# Altium footprint library Connectors.PcbLib: 122 footprints (part 4 of 8)
Each footprint in its own frame and in the unit in brackets; x right, y up, seen from the top. Pads: shape width x height; smd on the part's side, far side on the other; paste and mask are expansions set on the pad; w line width, h text height; cw(c..) or ccw(c..) is an arc to the next point about the centre after c.
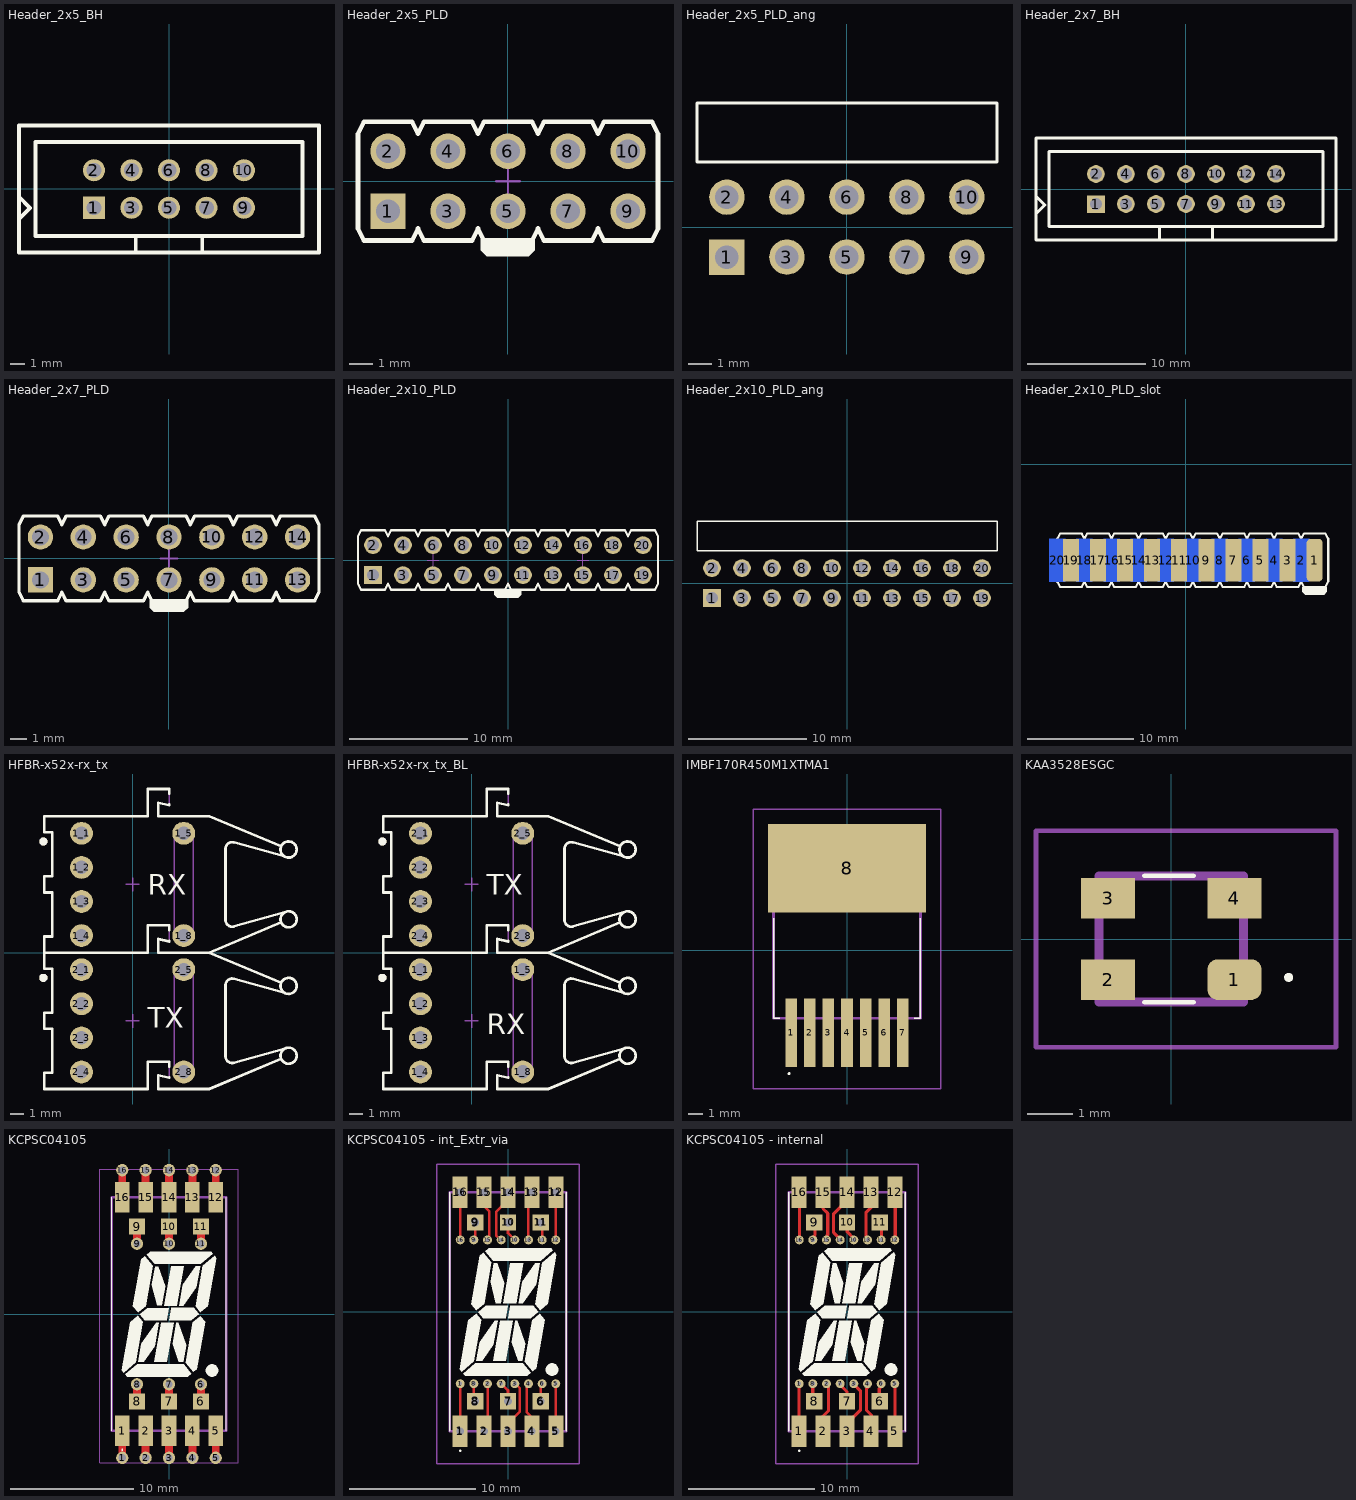
[diagram p3: the footprints below, top view; thin cyan lines are the x and y axes]

## Header_2x5_BH [mm] "BH-10_IDC-10_DS-1013-10S"
height 9
pads (10):
  rect 1.5x1.5 hole 1: 1(-5.08,-1.27)
  round 1.5 hole 1: 2(-5.08,1.27) 3(-2.54,-1.27) 4(-2.54,1.27) 5(0,-1.27) 6(0,1.27) 7(2.54,-1.27) 8(2.54,1.27) 9(5.08,-1.27) 10(5.08,1.27)
Top Overlay:
  lines w0.254: -2.25,-4.3 -2.25,-3.18 2.25,-3.18 2.25,-4.3 ; -10.16,-4.3 -10.16,4.3 10.16,4.3 10.16,-4.3 -10.16,-4.3 ; -10.16,-2.031 -10.16,-0.531 -9.41,-1.281 -10.16,-2.031 ; -9.04,-3.18 9.04,-3.18 9.04,3.18 -9.04,3.18 -9.04,-3.18
3D body "BH-10_IDC-10_DS-1013-10S.STEP": height 9, standoff -3, extent -10.16,-4.375 10.16,4.725

## Header_2x5_PLD [mm] "6 Contacts - Pitch 2.54mm - Dual Row Through Mount Straight Header (Post Lead = 6.35mm, Tail Lead 3.05mm, Insulator 1.52mm)"
height 7.87
pads (10):
  rect 1.5x1.5 hole 1: 1(-5.08,-1.27)
  round 1.5 hole 1: 2(-5.08,1.27) 3(-2.54,-1.27) 4(-2.54,1.27) 5(0,-1.27) 6(0,1.27) 7(2.54,-1.27) 8(2.54,1.27) 9(5.08,-1.27) 10(5.08,1.27)
Top Overlay:
  region: -1.143,-2.464 -1.143,-2.921 -0.889,-3.175 0.889,-3.175 1.143,-2.921 1.143,-2.464
  lines w0.2: -6.35,-2.007 -6.35,2.007 -6.096,2.515 -4.064,2.515 -3.81,2.007 -3.556,2.515 -1.524,2.515 -1.27,2.007 -1.016,2.515 1.016,2.515 1.27,2.007 1.524,2.515 3.556,2.515 3.81,2.007 4.064,2.515 6.096,2.515 6.35,2.007 6.35,-2.007 6.096,-2.515 4.064,-2.515 3.81,-2.007 3.556,-2.515 1.524,-2.515 1.27,-2.007 1.016,-2.515 -1.016,-2.515 -1.27,-2.007 -1.524,-2.515 -3.556,-2.515 -3.81,-2.007 -4.064,-2.515 -6.096,-2.515 -6.35,-2.007
Mechanical 8:
  lines w0.1: -0.5,0 0,0 ; 0,-0.5 0,0 ; 0,0.5 0,0 ; 0.5,0 0,0
Mechanical 14:
  lines w0.1: -6.35,-2.007 -6.096,-2.515 -4.064,-2.515 -3.81,-2.007 -3.556,-2.515 -1.524,-2.515 -1.27,-2.007 -1.016,-2.515 1.016,-2.515 1.27,-2.007 1.524,-2.515 3.556,-2.515 3.81,-2.007 4.064,-2.515 6.096,-2.515 6.35,-2.007 6.35,2.007 6.096,2.515 4.064,2.515 3.81,2.007 3.556,2.515 1.524,2.515 1.27,2.007 1.016,2.515 -1.016,2.515 -1.27,2.007 -1.524,2.515 -3.556,2.515 -3.81,2.007 -4.064,2.515 -6.096,2.515 -6.35,2.007 -6.35,-2.007
3D body "BH-10_PLD-6.stp": height 7.87, standoff -3.05, extent -6.35,-2.514 6.35,2.515

## Header_2x5_PLD_ang [mm]
pads (10):
  rect 1.5x1.5 hole 1: 1(-5.08,-1.27)
  round 1.5 hole 1: 2(-5.08,1.27) 3(-2.54,-1.27) 4(-2.54,1.27) 5(0,-1.27) 6(0,1.27) 7(2.54,-1.27) 8(2.54,1.27) 9(5.08,-1.27) 10(5.08,1.27)
Top Overlay:
  lines w0.127: -6.348,2.75 -6.348,5.25 6.357,5.25 6.357,2.75 -6.348,2.75
3D body "HR-2x5.STEP": height 5.08, standoff -3, extent -6.35,-1.612 6.35,11.25

## Header_2x7_BH [mm] "BH-14_IDC-14_DS-1013-14S"
height 9
pads (14):
  rect 1.5x1.5 hole 1: 1(-7.62,-1.281)
  round 1.5 hole 1: 2(-7.62,1.27) 3(-5.08,-1.27) 4(-5.08,1.27) 5(-2.54,-1.27) 6(-2.54,1.27) 7(0,-1.27) 8(0,1.27) 9(2.54,-1.27) 10(2.54,1.27) 11(5.08,-1.27) 12(5.08,1.27) 13(7.62,-1.27) 14(7.62,1.281)
Top Overlay:
  lines w0.254: -2.25,-4.3 -2.25,-3.18 2.25,-3.18 2.25,-4.3 ; -12.69,-2.106 -11.94,-1.356 -12.69,-0.606 -12.69,-2.106 ; -12.683,-4.3 -7.62,-4.3 7.62,-4.3 12.696,-4.3 12.696,4.3 7.62,4.3 -7.62,4.3 -12.683,4.3 -12.683,-4.3 ; -11.57,-3.18 -11.57,3.18 11.576,3.18 11.576,-3.18 -11.57,-3.18
3D body "BH-14_IDC-14_DS-1013-14S.STEP": height 9, standoff -3, extent -12.69,-4.375 12.69,4.725

## Header_2x7_PLD [mm] "6 Contacts - Pitch 2.54mm - Dual Row Through Mount Straight Header (Post Lead = 6.35mm, Tail Lead 3.05mm, Insulator 1.52mm)"
height 7.87
pads (14):
  rect 1.5x1.5 hole 1: 1(-7.62,-1.27)
  round 1.5 hole 1: 2(-7.62,1.27) 3(-5.08,-1.27) 4(-5.08,1.27) 5(-2.54,-1.27) 6(-2.54,1.27) 7(0,-1.27) 8(0,1.27) 9(2.54,-1.27) 10(2.54,1.27) 11(5.08,-1.27) 12(5.08,1.27) 13(7.62,-1.27) 14(7.62,1.27)
Top Overlay:
  region: -1.143,-2.464 -1.143,-2.921 -0.889,-3.175 0.889,-3.175 1.143,-2.921 1.143,-2.464
  lines w0.2: -8.89,-2.007 -8.89,2.007 -8.636,2.515 -6.604,2.515 -6.35,2.007 -6.096,2.515 -4.064,2.515 -3.81,2.007 -3.556,2.515 -1.524,2.515 -1.27,2.007 -1.016,2.515 1.016,2.515 1.27,2.007 1.524,2.515 3.556,2.515 3.81,2.007 4.064,2.515 6.096,2.515 6.35,2.007 6.604,2.515 8.636,2.515 8.89,2.007 8.89,-2.007 8.636,-2.515 6.604,-2.515 6.35,-2.007 6.096,-2.515 4.064,-2.515 3.81,-2.007 3.556,-2.515 1.524,-2.515 1.27,-2.007 1.016,-2.515 -1.016,-2.515 -1.27,-2.007 -1.524,-2.515 -3.556,-2.515 -3.81,-2.007 -4.064,-2.515 -6.096,-2.515 -6.35,-2.007 -6.604,-2.515 -8.636,-2.515 -8.89,-2.007
Mechanical 8:
  lines w0.1: -0.5,0 0,0 ; 0,-0.5 0,0 ; 0,0.5 0,0 ; 0.5,0 0,0
Mechanical 14:
  lines w0.1: -8.89,-2.007 -8.89,2.007 -8.636,2.515 -6.604,2.515 -6.35,2.007 -6.096,2.515 -4.064,2.515 -3.81,2.007 -3.556,2.515 -1.524,2.515 -1.27,2.007 -1.016,2.515 1.016,2.515 1.27,2.007 1.524,2.515 3.556,2.515 3.81,2.007 4.064,2.515 6.096,2.515 6.35,2.007 6.604,2.515 8.636,2.515 8.89,2.007 8.89,-2.007 8.636,-2.515 6.604,-2.515 6.35,-2.007 6.096,-2.515 4.064,-2.515 3.81,-2.007 3.556,-2.515 1.524,-2.515 1.27,-2.007 1.016,-2.515 -1.016,-2.515 -1.27,-2.007 -1.524,-2.515 -3.556,-2.515 -3.81,-2.007 -4.064,-2.515 -6.096,-2.515 -6.35,-2.007 -6.604,-2.515 -8.636,-2.515 -8.89,-2.007
3D body "BH-14_PLD-14.stp": height 7.87, standoff -3.05, extent -8.89,-2.514 8.89,2.515

## Header_2x10_PLD [mm] "6 Contacts - Pitch 2.54mm - Dual Row Through Mount Straight Header (Post Lead = 6.35mm, Tail Lead 3.05mm, Insulator 1.52mm)"
height 7.87
pads (20):
  rect 1.5x1.5 hole 1: 1(-11.43,-1.27)
  round 1.5 hole 1: 2(-11.43,1.27) 3(-8.89,-1.27) 4(-8.89,1.27) 5(-6.35,-1.27) 6(-6.35,1.27) 7(-3.81,-1.27) 8(-3.81,1.27) 9(-1.27,-1.27) 10(-1.27,1.27) 11(1.27,-1.27) 12(1.27,1.27) 13(3.81,-1.27) 14(3.81,1.27) 15(6.35,-1.27) 16(6.35,1.27) 17(8.89,-1.27) 18(8.89,1.27) 19(11.43,-1.27) 20(11.43,1.27)
Top Overlay:
  region: -1.143,-2.464 -1.143,-2.921 -0.889,-3.175 0.889,-3.175 1.143,-2.921 1.143,-2.464
  lines w0.2: 12.7,-2.007 12.446,-2.515 10.414,-2.515 10.16,-2.007 9.906,-2.515 7.874,-2.515 7.62,-2.007 7.366,-2.515 5.334,-2.515 5.08,-2.007 4.826,-2.515 2.794,-2.515 2.54,-2.007 2.286,-2.515 0.254,-2.515 0,-2.007 -0.254,-2.515 -2.286,-2.515 -2.54,-2.007 -2.794,-2.515 -4.826,-2.515 -5.08,-2.007 -5.334,-2.515 -7.366,-2.515 -7.62,-2.007 -7.874,-2.515 -9.906,-2.515 -10.16,-2.007 -10.414,-2.515 -12.446,-2.515 -12.7,-2.007 -12.7,2.007 -12.446,2.515 -10.414,2.515 -10.16,2.007 -9.906,2.515 -7.874,2.515 -7.62,2.007 -7.366,2.515 -5.334,2.515 -5.08,2.007 -4.826,2.515 -2.794,2.515 -2.54,2.007 -2.286,2.515 -0.254,2.515 0,2.007 0.254,2.515 2.286,2.515 2.54,2.007 2.794,2.515 4.826,2.515 5.08,2.007 5.334,2.515 7.366,2.515 7.62,2.007 7.874,2.515 9.906,2.515 10.16,2.007 10.414,2.515 12.446,2.515 12.7,2.007 ; 12.7,-1.981 12.7,2.032
Mechanical 8:
  lines w0.1: -6.85,0 -6.35,0 ; -6.35,-0.5 -6.35,0 ; -6.35,0.5 -6.35,0 ; -5.85,0 -6.35,0 ; 5.85,0 6.35,0 ; 6.35,-0.5 6.35,0 ; 6.35,0.5 6.35,0 ; 6.85,0 6.35,0
Mechanical 14:
  lines w0.1: 12.7,-2.007 12.446,-2.515 10.414,-2.515 10.16,-2.007 9.906,-2.515 7.874,-2.515 7.62,-2.007 7.366,-2.515 5.334,-2.515 5.08,-2.007 4.826,-2.515 2.794,-2.515 2.54,-2.007 2.286,-2.515 0.254,-2.515 0,-2.007 -0.254,-2.515 -2.286,-2.515 -2.54,-2.007 -2.794,-2.515 -4.826,-2.515 -5.08,-2.007 -5.334,-2.515 -7.366,-2.515 -7.62,-2.007 -7.874,-2.515 -9.906,-2.515 -10.16,-2.007 -10.414,-2.515 -12.446,-2.515 -12.7,-2.007 -12.7,2.007 -12.446,2.515 -10.414,2.515 -10.16,2.007 -9.906,2.515 -7.874,2.515 -7.62,2.007 -7.366,2.515 -5.334,2.515 -5.08,2.007 -4.826,2.515 -2.794,2.515 -2.54,2.007 -2.286,2.515 -0.254,2.515 0,2.007 0.254,2.515 2.286,2.515 2.54,2.007 2.794,2.515 4.826,2.515 5.08,2.007 5.334,2.515 7.366,2.515 7.62,2.007 7.874,2.515 9.906,2.515 10.16,2.007 10.414,2.515 12.446,2.515 12.7,2.007 ; 12.7,-1.981 12.7,2.032
3D body "BH-10_PLD-6.stp": height 7.87, standoff -3.05, extent -12.7,-2.514 0,2.515
3D body "BH-10_PLD-6.stp": height 7.87, standoff -3.05, extent 0,-2.515 12.7,2.514

## Header_2x10_PLD_ang [mm]
pads (20):
  rect 1.5x1.5 hole 1: 1(-11.43,-1.27)
  round 1.5 hole 1: 2(-11.43,1.27) 3(-8.89,-1.27) 4(-8.89,1.27) 5(-6.35,-1.27) 6(-6.35,1.27) 7(-3.81,-1.27) 8(-3.81,1.27) 9(-1.27,-1.27) 10(-1.27,1.27) 11(1.27,-1.27) 12(1.27,1.27) 13(3.81,-1.27) 14(3.81,1.27) 15(6.35,-1.27) 16(6.35,1.27) 17(8.89,-1.27) 18(8.89,1.27) 19(11.43,-1.27) 20(11.43,1.27)
Top Overlay:
  lines w0.127: -12.7,2.75 -12.7,5.25 12.7,5.25 12.7,2.75 -12.7,2.75
3D body "HR-2x5.STEP": height 5.21, standoff -2.87, extent 0,-1.612 12.7,11.25
3D body "HR-2x5.STEP": height 5.21, standoff -2.87, extent -12.7,-1.612 0,11.25

## Header_2x10_PLD_slot [mm] "6 Contacts - Pitch 2.54mm - Dual Row Through Mount Straight Header (Post Lead = 6.35mm, Tail Lead 3.05mm, Insulator 1.52mm)"
height 7.87
pads (20):
  rrect50% 1.5x4 smd: 1(12.089,-9)
  rect 1.5x4 smd far side: 2(10.819,-9) 4(8.279,-9) 6(5.739,-9) 8(3.199,-9) 10(0.659,-9) 12(-1.881,-9) 14(-4.421,-9) 16(-6.961,-9) 18(-9.501,-9) 20(-12.041,-9)
  rect 1.5x4 smd: 3(9.549,-9) 5(7.009,-9) 7(4.469,-9) 9(1.929,-9) 11(-0.611,-9) 13(-3.151,-9) 15(-5.691,-9) 17(-8.231,-9) 19(-10.771,-9)
Top Overlay:
  region: 10.946,-11.515 10.946,-11.972 11.2,-12.226 12.978,-12.226 13.232,-11.972 13.232,-11.515
  lines w0.2: -12.041,-11.007 -11.787,-11.515 -9.755,-11.515 -9.501,-11.007 -9.247,-11.515 -7.215,-11.515 -6.961,-11.007 -6.707,-11.515 -4.675,-11.515 -4.421,-11.007 -4.167,-11.515 -2.135,-11.515 -1.881,-11.007 -1.627,-11.515 0.405,-11.515 0.659,-11.007 0.913,-11.515 2.945,-11.515 3.199,-11.007 3.453,-11.515 5.485,-11.515 5.739,-11.007 5.993,-11.515 8.025,-11.515 8.279,-11.007 8.533,-11.515 10.565,-11.515 10.819,-11.007 11.073,-11.515 13.105,-11.515 13.359,-11.007 ; -12.041,-6.993 -11.787,-6.485 -9.755,-6.485 -9.501,-6.993 -9.247,-6.485 -7.215,-6.485 -6.961,-6.993 -6.707,-6.485 -4.675,-6.485 -4.421,-6.993 -4.167,-6.485 -2.135,-6.485 -1.881,-6.993 -1.627,-6.485 0.405,-6.485 0.659,-6.993 0.913,-6.485 2.945,-6.485 3.199,-6.993 3.453,-6.485 5.485,-6.485 5.739,-6.993 5.993,-6.485 8.025,-6.485 8.279,-6.993 8.533,-6.485 10.565,-6.485 10.819,-6.993 11.073,-6.485 13.105,-6.485 13.359,-6.993 ; -9.501,-10.981 -9.501,-6.968 ; -6.961,-10.981 -6.961,-6.968 ; -4.421,-10.981 -4.421,-6.968 ; -1.881,-10.981 -1.881,-6.968 ; 0.659,-10.981 0.659,-6.968 ; 3.199,-10.981 3.199,-6.968 ; 5.739,-10.981 5.739,-6.968 ; 8.279,-10.981 8.279,-6.968 ; 10.819,-10.981 10.819,-6.968 ; 13.359,-10.981 13.359,-6.968
  lines w0.254: -12.041,-11.007 -12.041,-6.993 ; -9.501,-11.007 -9.501,-6.993 ; -6.961,-11.007 -6.961,-6.993 ; -4.421,-11.007 -4.421,-6.993 ; -1.881,-11.007 -1.881,-6.993 ; 0.659,-11.007 0.659,-6.993 ; 3.199,-11.007 3.199,-6.993 ; 5.739,-11.007 5.739,-6.993 ; 8.279,-11.007 8.279,-6.993 ; 10.819,-11.007 10.819,-6.993
Bottom Overlay:
  lines w0.2: -12.791,-11.007 -12.537,-11.515 -10.505,-11.515 -10.251,-11.007 -9.997,-11.515 -7.965,-11.515 -7.711,-11.007 -7.457,-11.515 -5.425,-11.515 -5.171,-11.007 -4.917,-11.515 -2.885,-11.515 -2.631,-11.007 -2.377,-11.515 -0.345,-11.515 -0.091,-11.007 0.163,-11.515 2.195,-11.515 2.449,-11.007 2.703,-11.515 4.735,-11.515 4.989,-11.007 5.243,-11.515 7.275,-11.515 7.529,-11.007 7.783,-11.515 9.815,-11.515 10.069,-11.007 10.323,-11.515 12.355,-11.515 12.609,-11.007 ; -12.791,-6.993 -12.537,-6.485 -10.505,-6.485 -10.251,-6.993 -9.997,-6.485 -7.965,-6.485 -7.711,-6.993 -7.457,-6.485 -5.425,-6.485 -5.171,-6.993 -4.917,-6.485 -2.885,-6.485 -2.631,-6.993 -2.377,-6.485 -0.345,-6.485 -0.091,-6.993 0.163,-6.485 2.195,-6.485 2.449,-6.993 2.703,-6.485 4.735,-6.485 4.989,-6.993 5.243,-6.485 7.275,-6.485 7.529,-6.993 7.783,-6.485 9.815,-6.485 10.069,-6.993 10.323,-6.485 12.355,-6.485 12.609,-6.993 ; -10.251,-10.981 -10.251,-6.968 ; -7.711,-10.981 -7.711,-6.968 ; -5.171,-10.981 -5.171,-6.968 ; -2.631,-10.981 -2.631,-6.968 ; -0.091,-10.981 -0.091,-6.968 ; 2.449,-10.981 2.449,-6.968 ; 4.989,-10.981 4.989,-6.968 ; 7.529,-10.981 7.529,-6.968 ; 10.069,-10.981 10.069,-6.968 ; 12.609,-10.981 12.609,-6.968
  lines w0.254: -12.791,-11.007 -12.791,-6.993 ; -10.251,-11.007 -10.251,-6.993 ; -7.711,-11.007 -7.711,-6.993 ; -5.171,-11.007 -5.171,-6.993 ; -2.631,-11.007 -2.631,-6.993 ; -0.091,-11.007 -0.091,-6.993 ; 2.449,-11.007 2.449,-6.993 ; 4.989,-11.007 4.989,-6.993 ; 7.529,-11.007 7.529,-6.993 ; 10.069,-11.007 10.069,-6.993
3D body "IDC.STEP": height 2.99, standoff -4.03, extent -15.03,-8 15.03,1

## HFBR-x52x-rx_tx [mm] "HFBR-0500Z Series, Fiber Optic Transmitter adn Receiver, Through Hole Mount"
height 7.62
pads (12):
  round 1.7 hole 1: 1_1(-3.81,8.89) 1_2(-3.81,6.35) 1_3(-3.81,3.81) 1_4(-3.81,1.27) 1_5(3.81,8.89) 1_8(3.81,1.27) 2_1(-3.81,-1.27) 2_2(-3.81,-3.81) 2_3(-3.81,-6.35) 2_4(-3.81,-8.89) 2_5(3.81,-1.27) 2_8(3.81,-8.89)
Top Overlay:
  circle w0.3: c-6.65,8.28 r0.15
  circle w0.2: c11.62,7.68 r0.6
  circle w0.2: c11.62,2.48 r0.6
  circle w0.2: c11.62,-7.68 r0.6
  circle w0.2: c11.62,-2.48 r0.6
  circle w0.3: c-6.65,-1.88 r0.15
  lines w0.2: 2.72,-9.28 2.72,-9.33 1.92,-9.145 1.92,-10.16 5.72,-10.16 11.067,-7.913 cw(c11.62,-7.68) 11.311,-7.166 7.554,-8.209 cw(c7.42,-7.727) 6.923,-7.78 6.923,-2.38 cw(c7.42,-2.433) 7.554,-1.951 11.311,-2.994 cw(c11.62,-2.48) 11.067,-2.247 5.72,0 ; 2.72,-8.48 2.72,-8.13 1.12,-8.13 1.12,-10.16 -6.58,-10.16 -6.58,-8.96 -5.98,-8.96 -5.98,-5.68 -6.58,-5.68 -6.58,-4.48 -5.98,-4.48 -5.98,-1.2 -6.58,-1.2 -6.58,0 ; 2.72,11.04 2.72,10.99 1.92,11.175 1.92,10.16 5.72,10.16 11.067,7.913 ccw(c11.62,7.68) 11.311,7.166 7.554,8.209 ccw(c7.42,7.727) 6.923,7.78 6.923,2.38 ccw(c7.42,2.433) 7.554,1.951 11.311,2.994 ccw(c11.62,2.48) 11.067,2.247 5.72,0 ; 2.72,11.84 2.72,12.19 1.12,12.19 1.12,10.16 -6.58,10.16 -6.58,8.96 -5.98,8.96 -5.98,5.68 -6.58,5.68 -6.58,4.48 -5.98,4.48 -5.98,1.2 -6.58,1.2 -6.58,0 ; -6.58,0 1.12,0 ; -6.58,0 1.12,0 ; 1.12,0 1.12,2.03 ; 1.12,0 1.12,2.03 ; 1.12,2.03 2.72,2.03 ; 1.12,2.03 2.72,2.03 ; 1.92,0 5.72,0 ; 1.92,0 1.92,1.015 ; 1.92,0 1.92,1.015 ; 1.92,0 5.72,0 ; 1.92,1.015 2.72,0.83 ; 1.92,1.015 2.72,0.83 ; 2.72,0.83 2.72,0.88 2.72,0.83 ; 2.72,2.03 2.72,1.68 2.72,2.03
  text "TX" at 1.143,-5.588 h1.52
  text "RX" at 1.143,4.318 h1.52
Mechanical 8:
  lines w0.1: -4.31,-8.89 -3.81,-8.89 ; -4.31,-6.35 -3.81,-6.35 ; -4.31,-3.81 -3.81,-3.81 ; -4.31,-1.27 -3.81,-1.27 ; -4.31,1.27 -3.81,1.27 ; -4.31,3.81 -3.81,3.81 ; -4.31,6.35 -3.81,6.35 ; -4.31,8.89 -3.81,8.89 ; -3.81,-9.39 -3.81,-8.89 ; -3.81,-8.39 -3.81,-8.89 ; -3.81,-6.85 -3.81,-6.35 ; -3.81,-5.85 -3.81,-6.35 ; -3.81,-4.31 -3.81,-3.81 ; -3.81,-3.31 -3.81,-3.81 ; -3.81,-1.77 -3.81,-1.27 ; -3.81,-0.77 -3.81,-1.27 ; -3.81,0.77 -3.81,1.27 ; -3.81,1.77 -3.81,1.27 ; -3.81,3.31 -3.81,3.81 ; -3.81,4.31 -3.81,3.81 ; -3.81,5.85 -3.81,6.35 ; -3.81,6.85 -3.81,6.35 ; -3.81,8.39 -3.81,8.89 ; -3.81,9.39 -3.81,8.89 ; -3.31,-8.89 -3.81,-8.89 ; -3.31,-6.35 -3.81,-6.35 ; -3.31,-3.81 -3.81,-3.81 ; -3.31,-1.27 -3.81,-1.27 ; -3.31,1.27 -3.81,1.27 ; -3.31,3.81 -3.81,3.81 ; -3.31,6.35 -3.81,6.35 ; -3.31,8.89 -3.81,8.89 ; -0.5,-5.08 0,-5.08 ; -0.5,5.08 0,5.08 ; 0,-5.58 0,-5.08 ; 0,-4.58 0,-5.08 ; 0,4.58 0,5.08 ; 0,5.58 0,5.08 ; 0.5,-5.08 0,-5.08 ; 0.5,5.08 0,5.08 ; 3.31,-8.89 3.81,-8.89 ; 3.31,-1.27 3.81,-1.27 ; 3.31,1.27 3.81,1.27 ; 3.31,8.89 3.81,8.89 ; 3.81,-9.39 3.81,-8.89 ; 3.81,-8.39 3.81,-8.89 ; 3.81,-1.77 3.81,-1.27 ; 3.81,-0.77 3.81,-1.27 ; 3.81,0.77 3.81,1.27 ; 3.81,1.77 3.81,1.27 ; 3.81,8.39 3.81,8.89 ; 3.81,9.39 3.81,8.89 ; 4.31,-8.89 3.81,-8.89 ; 4.31,-1.27 3.81,-1.27 ; 4.31,1.27 3.81,1.27 ; 4.31,8.89 3.81,8.89
Mechanical 14:
  circle w0.3: c-6.65,8.28 r0.15
  circle w0.1: c11.62,2.48 r0.6
  circle w0.1: c11.62,7.68 r0.6
  circle w0.1: c11.62,-2.48 r0.6
  circle w0.1: c11.62,-7.68 r0.6
  circle w0.3: c-6.65,-1.88 r0.15
  lines w0.1: -6.58,0 1.12,0 ; -6.58,0 -6.58,1.2 -5.98,1.2 -5.98,4.48 -6.58,4.48 -6.58,5.68 -5.98,5.68 -5.98,8.96 -6.58,8.96 -6.58,10.16 1.12,10.16 1.12,12.19 2.72,12.19 2.72,10.99 1.92,11.175 1.92,10.16 5.72,10.16 11.067,7.913 ccw(c11.62,7.68) 11.311,7.166 7.554,8.209 ccw(c7.42,7.727) 6.923,7.78 6.923,2.38 ccw(c7.42,2.433) 7.554,1.951 11.311,2.994 ccw(c11.62,2.48) 11.067,2.247 5.72,0 ; -6.58,0 1.12,0 ; -6.58,0 -6.58,-1.2 -5.98,-1.2 -5.98,-4.48 -6.58,-4.48 -6.58,-5.68 -5.98,-5.68 -5.98,-8.96 -6.58,-8.96 -6.58,-10.16 1.12,-10.16 1.12,-8.13 2.72,-8.13 2.72,-9.33 1.92,-9.145 1.92,-10.16 5.72,-10.16 11.067,-7.913 cw(c11.62,-7.68) 11.311,-7.166 7.554,-8.209 cw(c7.42,-7.727) 6.923,-7.78 6.923,-2.38 cw(c7.42,-2.433) 7.554,-1.951 11.311,-2.994 cw(c11.62,-2.48) 11.067,-2.247 5.72,0 ; 1.12,0 1.12,2.03 ; 1.12,0 1.12,2.03 ; 1.12,2.03 2.72,2.03 ; 1.12,2.03 2.72,2.03 ; 1.92,0 1.92,1.015 ; 1.92,0 5.72,0 ; 1.92,0 5.72,0 ; 1.92,0 1.92,1.015 ; 1.92,1.015 2.72,0.83 ; 1.92,1.015 2.72,0.83 ; 2.72,0.83 2.72,2.03 ; 2.72,0.83 2.72,2.03 ; 3.11,-8.89 ccw(c3.81,-8.89) 4.51,-8.89 4.51,-1.27 ccw(c3.81,-1.27) 3.11,-1.27 3.11,-8.89 ; 3.11,1.27 ccw(c3.81,1.27) 4.51,1.27 4.51,8.89 ccw(c3.81,8.89) 3.11,8.89 3.11,1.27
3D body "HFBR-x52x.stp": height 7.66, standoff -4, extent -6.58,0 12.22,12.19
3D body "HFBR-x52x.stp": height 7.66, standoff -4, extent -6.58,-10.16 12.22,2.03

## HFBR-x52x-rx_tx_BL [mm] "HFBR-0500Z Series, Fiber Optic Transmitter adn Receiver, Through Hole Mount"
height 7.62
pads (12):
  round 1.7 hole 1: 1_1(-3.81,-1.27) 1_2(-3.81,-3.81) 1_3(-3.81,-6.35) 1_4(-3.81,-8.89) 1_5(3.81,-1.27) 1_8(3.81,-8.89) 2_1(-3.81,8.89) 2_2(-3.81,6.35) 2_3(-3.81,3.81) 2_4(-3.81,1.27) 2_5(3.81,8.89) 2_8(3.81,1.27)
Top Overlay:
  circle w0.3: c-6.65,-1.88 r0.15
  circle w0.3: c-6.65,8.28 r0.15
  circle w0.2: c11.62,-2.48 r0.6
  circle w0.2: c11.62,-7.68 r0.6
  circle w0.2: c11.62,2.48 r0.6
  circle w0.2: c11.62,7.68 r0.6
  lines w0.2: 2.72,-9.28 2.72,-9.33 1.92,-9.145 1.92,-10.16 5.72,-10.16 11.067,-7.913 cw(c11.62,-7.68) 11.311,-7.166 7.554,-8.209 cw(c7.42,-7.727) 6.923,-7.78 6.923,-2.38 cw(c7.42,-2.433) 7.554,-1.951 11.311,-2.994 cw(c11.62,-2.48) 11.067,-2.247 5.72,0 ; 2.72,-8.48 2.72,-8.13 1.12,-8.13 1.12,-10.16 -6.58,-10.16 -6.58,-8.96 -5.98,-8.96 -5.98,-5.68 -6.58,-5.68 -6.58,-4.48 -5.98,-4.48 -5.98,-1.2 -6.58,-1.2 -6.58,0 ; 2.72,11.04 2.72,10.99 1.92,11.175 1.92,10.16 5.72,10.16 11.067,7.913 ccw(c11.62,7.68) 11.311,7.166 7.554,8.209 ccw(c7.42,7.727) 6.923,7.78 6.923,2.38 ccw(c7.42,2.433) 7.554,1.951 11.311,2.994 ccw(c11.62,2.48) 11.067,2.247 5.72,0 ; 2.72,11.84 2.72,12.19 1.12,12.19 1.12,10.16 -6.58,10.16 -6.58,8.96 -5.98,8.96 -5.98,5.68 -6.58,5.68 -6.58,4.48 -5.98,4.48 -5.98,1.2 -6.58,1.2 -6.58,0 ; -6.58,0 1.12,0 ; -6.58,0 1.12,0 ; 1.12,0 1.12,2.03 ; 1.12,0 1.12,2.03 ; 1.12,2.03 2.72,2.03 ; 1.12,2.03 2.72,2.03 ; 1.92,0 1.92,1.015 ; 1.92,0 1.92,1.015 ; 1.92,0 5.72,0 ; 1.92,0 5.72,0 ; 1.92,1.015 2.72,0.83 ; 1.92,1.015 2.72,0.83 ; 2.72,0.83 2.72,0.88 2.72,0.83 ; 2.72,2.03 2.72,1.68 2.72,2.03
  text "TX" at 1.143,4.318 h1.52
  text "RX" at 1.143,-6.096 h1.52
Mechanical 8:
  lines w0.1: -4.31,-8.89 -3.81,-8.89 ; -4.31,-6.35 -3.81,-6.35 ; -4.31,-3.81 -3.81,-3.81 ; -4.31,-1.27 -3.81,-1.27 ; -4.31,1.27 -3.81,1.27 ; -4.31,3.81 -3.81,3.81 ; -4.31,6.35 -3.81,6.35 ; -4.31,8.89 -3.81,8.89 ; -3.81,-9.39 -3.81,-8.89 ; -3.81,-8.39 -3.81,-8.89 ; -3.81,-6.85 -3.81,-6.35 ; -3.81,-5.85 -3.81,-6.35 ; -3.81,-4.31 -3.81,-3.81 ; -3.81,-3.31 -3.81,-3.81 ; -3.81,-1.77 -3.81,-1.27 ; -3.81,-0.77 -3.81,-1.27 ; -3.81,0.77 -3.81,1.27 ; -3.81,1.77 -3.81,1.27 ; -3.81,3.31 -3.81,3.81 ; -3.81,4.31 -3.81,3.81 ; -3.81,5.85 -3.81,6.35 ; -3.81,6.85 -3.81,6.35 ; -3.81,8.39 -3.81,8.89 ; -3.81,9.39 -3.81,8.89 ; -3.31,-8.89 -3.81,-8.89 ; -3.31,-6.35 -3.81,-6.35 ; -3.31,-3.81 -3.81,-3.81 ; -3.31,-1.27 -3.81,-1.27 ; -3.31,1.27 -3.81,1.27 ; -3.31,3.81 -3.81,3.81 ; -3.31,6.35 -3.81,6.35 ; -3.31,8.89 -3.81,8.89 ; -0.5,-5.08 0,-5.08 ; -0.5,5.08 0,5.08 ; 0,-5.58 0,-5.08 ; 0,-4.58 0,-5.08 ; 0,4.58 0,5.08 ; 0,5.58 0,5.08 ; 0.5,-5.08 0,-5.08 ; 0.5,5.08 0,5.08 ; 3.31,-8.89 3.81,-8.89 ; 3.31,-1.27 3.81,-1.27 ; 3.31,1.27 3.81,1.27 ; 3.31,8.89 3.81,8.89 ; 3.81,-9.39 3.81,-8.89 ; 3.81,-8.39 3.81,-8.89 ; 3.81,-1.77 3.81,-1.27 ; 3.81,-0.77 3.81,-1.27 ; 3.81,0.77 3.81,1.27 ; 3.81,1.77 3.81,1.27 ; 3.81,8.39 3.81,8.89 ; 3.81,9.39 3.81,8.89 ; 4.31,-8.89 3.81,-8.89 ; 4.31,-1.27 3.81,-1.27 ; 4.31,1.27 3.81,1.27 ; 4.31,8.89 3.81,8.89
Mechanical 14:
  circle w0.3: c-6.65,8.28 r0.15
  circle w0.1: c11.62,2.48 r0.6
  circle w0.1: c11.62,7.68 r0.6
  circle w0.1: c11.62,-2.48 r0.6
  circle w0.1: c11.62,-7.68 r0.6
  circle w0.3: c-6.65,-1.88 r0.15
  lines w0.1: -6.58,0 1.12,0 ; -6.58,0 -6.58,1.2 -5.98,1.2 -5.98,4.48 -6.58,4.48 -6.58,5.68 -5.98,5.68 -5.98,8.96 -6.58,8.96 -6.58,10.16 1.12,10.16 1.12,12.19 2.72,12.19 2.72,10.99 1.92,11.175 1.92,10.16 5.72,10.16 11.067,7.913 ccw(c11.62,7.68) 11.311,7.166 7.554,8.209 ccw(c7.42,7.727) 6.923,7.78 6.923,2.38 ccw(c7.42,2.433) 7.554,1.951 11.311,2.994 ccw(c11.62,2.48) 11.067,2.247 5.72,0 ; -6.58,0 1.12,0 ; -6.58,0 -6.58,-1.2 -5.98,-1.2 -5.98,-4.48 -6.58,-4.48 -6.58,-5.68 -5.98,-5.68 -5.98,-8.96 -6.58,-8.96 -6.58,-10.16 1.12,-10.16 1.12,-8.13 2.72,-8.13 2.72,-9.33 1.92,-9.145 1.92,-10.16 5.72,-10.16 11.067,-7.913 cw(c11.62,-7.68) 11.311,-7.166 7.554,-8.209 cw(c7.42,-7.727) 6.923,-7.78 6.923,-2.38 cw(c7.42,-2.433) 7.554,-1.951 11.311,-2.994 cw(c11.62,-2.48) 11.067,-2.247 5.72,0 ; 1.12,0 1.12,2.03 ; 1.12,0 1.12,2.03 ; 1.12,2.03 2.72,2.03 ; 1.12,2.03 2.72,2.03 ; 1.92,0 1.92,1.015 ; 1.92,0 5.72,0 ; 1.92,0 5.72,0 ; 1.92,0 1.92,1.015 ; 1.92,1.015 2.72,0.83 ; 1.92,1.015 2.72,0.83 ; 2.72,0.83 2.72,2.03 ; 2.72,0.83 2.72,2.03 ; 3.11,-8.89 ccw(c3.81,-8.89) 4.51,-8.89 4.51,-1.27 ccw(c3.81,-1.27) 3.11,-1.27 3.11,-8.89 ; 3.11,1.27 ccw(c3.81,1.27) 4.51,1.27 4.51,8.89 ccw(c3.81,8.89) 3.11,8.89 3.11,1.27
3D body "HFBR-x52x.stp": height 7.66, standoff -4, extent -6.58,-10.16 12.22,2.03
3D body "HFBR-x52x.stp": height 7.66, standoff -4, extent -6.58,0 12.22,12.19

## IMBF170R450M1XTMA1 [mm]
pads (8):
  rect 0.8x4.7 smd: 1(-3.81,-5.612) 2(-2.54,-5.612) 3(-1.27,-5.612) 4(0,-5.612) 5(1.27,-5.612) 6(2.54,-5.612) 7(3.81,-5.612)
  rect 10.8x6.05 smd: 8(0,5.612)
Top Overlay:
  lines w0.1: -5,2.2 -5,-4.625 -4.6,-4.625 ; 4.6,-4.625 5,-4.625 5,2.2 ; -4,-8.4 ccw(c-3.95,-8.4) -3.9,-8.4 ccw(c-3.95,-8.4) -4,-8.4
Mechanical 13:
  lines w0.2: -5,-4.625 5,-4.625 5,4.625 -5,4.625 -5,-4.625
Mechanical 15:
  lines w0.1: -6.4,-9.45 6.4,-9.45 ; -6.4,-9.45 -6.4,9.637 ; -6.4,-9.45 6.4,-9.45 ; -6.4,-9.45 -6.4,9.637 ; -6.4,9.637 6.4,9.637 ; -6.4,9.637 6.4,9.637 ; 6.4,-9.45 6.4,9.637 ; 6.4,-9.45 6.4,9.637
3D body "IMBF170R450M1XTMA1.stp": height 4.8, standoff 0, extent -5,-7.882 5,8.032

## IRM-05-3.3_1 [mm]

## KAA3528ESGC [mm]
pads (4):
  rrect50% 1.2x0.9 smd: 1(1.4,-0.9)
  rect 1.2x0.9 smd: 2(-1.4,-0.9) 3(-1.4,0.9) 4(1.4,0.9)
Top Overlay:
  lines w0.1: -0.6,-1.4 0.5,-1.4 ; -0.6,1.4 0.5,1.4 ; 2.6,-0.9 cw(c2.6,-0.85) 2.6,-0.8 cw(c2.6,-0.85) 2.6,-0.9
Mechanical 13:
  lines w0.2: -1.6,-1.4 1.6,-1.4 1.6,1.4 -1.6,1.4 -1.6,-1.4
Mechanical 15:
  lines w0.1: -3,-2.4 3.65,-2.4 3.65,2.4 -3,2.4 -3,-2.4
3D body "APB3227.STEP": height 1.1, standoff 0, extent -1.6,-1.35 1.6,1.35

## KCPSC04105 [mm]
pads (32):
  round 1.001 hole 0.601: 1(-3.8,-11.696) 2(-1.9,-11.696) 3(0,-11.696) 4(1.9,-11.696) 5(3.8,-11.696) 6(2.6,-5.715) 7(0,-5.715) 8(-2.6,-5.715) 9(-2.6,5.715) 10(0,5.715) 11(2.6,5.715) 12(3.8,11.696) 13(1.9,11.696) 14(0,11.696) 15(-1.9,11.696) 16(-3.8,11.696)
  rect 1.2x2.5 smd: 1(-3.8,-9.5) 2(-1.9,-9.5) 3(0,-9.5) 4(1.9,-9.5) 5(3.8,-9.5) 12(3.8,9.5) 13(1.9,9.5) 14(0,9.5) 15(-1.9,9.5) 16(-3.8,9.5)
  rect 1.3x1.3 smd: 6(2.6,-7.1) 7(0,-7.1) 8(-2.6,-7.1) 9(-2.6,7.1) 10(0,7.1) 11(2.6,7.1)
Top Layer:
  lines w0.635: -3.8,-11.696 -3.8,-9.385 ; -3.8,9.5 -3.8,11.684 ; -2.6,-7.1 -2.6,-5.715 ; -2.6,5.715 -2.6,7.1 ; -1.9,-11.696 -1.9,-9.385 ; -1.9,9.385 -1.9,11.696 ; 0,-11.696 0,-9.385 ; 0,-7.1 0,-5.715 ; 0,5.715 0,7.1 ; 0,9.385 0,11.696 ; 1.9,-11.696 1.9,-9.385 ; 1.9,9.385 1.9,11.696 ; 2.6,-6.973 2.6,-5.588 ; 2.6,5.715 2.6,7.1 ; 3.8,-11.684 3.8,-9.5 ; 3.8,9.385 3.8,11.696
Top Overlay:
  drawing of 21 lines, arcs and shapes, not listed
Mechanical 13:
  lines w0.2: -4.65,-9.5 4.65,-9.5 4.65,9.5 -4.65,9.5 -4.65,-9.5
Mechanical 15:
  lines w0.1: -5.65,-12.1 5.65,-12.1 5.65,11.75 -5.65,11.75 -5.65,-12.1
3D body "KCPSC04-105.stp": height 3.85, standoff 0, extent -4.65,-10.63 4.65,10.63

## KCPSC04105 - int_Extr_via [mm]
pads (48):
  rect 1.2x2.5 smd: 1(-3.8,-9.5) 2(-1.9,-9.5) 3(0,-9.5) 4(1.9,-9.5) 5(3.8,-9.5) 12(3.8,9.5) 13(1.9,9.5) 14(0,9.5) 15(-1.9,9.5) 16(-3.8,9.5)
  round 1.01 hole 0.6: 1(-3.8,-9.5) 2(-1.9,-9.5) 3(0,-9.5) 4(1.9,-9.5) 5(3.8,-9.5) 6(2.6,-7.1) 7(0,-7.1) 8(-2.6,-7.1) 9(-2.6,7.1) 10(0,7.1) 11(2.6,7.1) 12(3.8,9.5) 13(1.9,9.5) 14(0,9.5) 15(-1.9,9.5) 16(-3.8,9.5)
  round 0.71 hole 0.31: 1(-3.8,-5.715) 2(-1.629,-5.715) 3(0.543,-5.715) 4(1.629,-5.715) 5(3.8,-5.715) 6(2.714,-5.715) 7(-0.543,-5.715) 8(-2.714,-5.715) 9(-2.714,5.715) 10(0.543,5.715) 11(2.714,5.715) 12(3.8,5.715) 13(1.629,5.715) 14(-0.543,5.715) 15(-1.629,5.715) 16(-3.8,5.715)
  rect 1.3x1.3 smd: 6(2.6,-7.1) 7(0,-7.1) 8(-2.6,-7.1) 9(-2.6,7.1) 10(0,7.1) 11(2.6,7.1)
Top Layer:
  lines w0.02: -3.8,-5.715 ccw(c-3.8,-5.715) -3.8,-5.715
  lines w0.2: -3.8,-9.5 -3.8,-5.715 ; -3.8,5.715 -3.8,9.5 ; -2.714,-6.986 -2.714,-5.715 ; -2.714,5.715 -2.685,5.715 -2.6,5.8 -2.6,7.1 ; -1.9,-9.5 -1.629,-9.229 -1.629,-5.715 ; -1.9,9.5 -1.9,8.4 -1.5,8 -1.5,5.844 -1.629,5.715 ; -0.543,5.715 -0.59,5.715 -0.95,6.075 -0.95,7.925 0,8.875 0,9.5 ; -0.51,-5.715 -0.543,-5.715 -0.535,-5.715 0,-6.25 0,-7.1 ; 0,-9.5 0,-8.875 0.95,-7.925 0.95,-6.075 0.59,-5.715 0.543,-5.715 ; 0,7.1 0,6.25 0.535,5.715 0.543,5.715 0.51,5.715 ; 1.629,-5.715 1.5,-5.844 1.5,-8 1.9,-8.4 1.9,-9.5 ; 1.629,5.715 1.629,9.229 1.9,9.5 ; 2.6,-7.1 2.6,-5.8 2.685,-5.715 2.714,-5.715 ; 2.714,5.715 2.714,6.986 ; 3.8,-9.5 3.8,-5.715 ; 3.8,5.715 3.8,9.5
Top Overlay:
  drawing of 21 lines, arcs and shapes, not listed
Mechanical 13:
  lines w0.2: -4.65,-9.5 -4.65,9.5 4.65,9.5 4.65,-9.5 -4.65,-9.5
Mechanical 15:
  lines w0.1: -5.65,-12.1 -5.65,11.75 5.65,11.75 5.65,-12.1 -5.65,-12.1
3D body "KCPSC04-105.STEP": height 3.75, standoff 0, extent -4.65,-9.5 4.65,9.5

## KCPSC04105 - internal [mm]
pads (32):
  rect 1.2x2.5 smd: 1(-3.8,-9.5) 2(-1.9,-9.5) 3(0,-9.5) 4(1.9,-9.5) 5(3.8,-9.5) 12(3.8,9.5) 13(1.9,9.5) 14(0,9.5) 15(-1.9,9.5) 16(-3.8,9.5)
  round 0.71 hole 0.31: 1(-3.8,-5.715) 2(-1.629,-5.715) 3(0.543,-5.715) 4(1.629,-5.715) 5(3.8,-5.715) 6(2.714,-5.715) 7(-0.543,-5.715) 8(-2.714,-5.715) 9(-2.714,5.715) 10(0.543,5.715) 11(2.714,5.715) 12(3.8,5.715) 13(1.629,5.715) 14(-0.543,5.715) 15(-1.629,5.715) 16(-3.8,5.715)
  rect 1.3x1.3 smd: 6(2.6,-7.1) 7(0,-7.1) 8(-2.6,-7.1) 9(-2.6,7.1) 10(0,7.1) 11(2.6,7.1)
Top Layer:
  lines w0.254: -3.81,-9.525 -3.81,-5.715 ; -3.785,5.715 -3.785,9.474 ; -2.718,-7.137 -2.718,-5.715 ; -2.692,5.715 -2.692,5.944 -2.54,6.096 -2.54,7.112 ; -1.905,-9.474 -1.905,-8.306 -1.473,-7.874 -1.473,-5.74 -1.626,-5.74 ; -1.905,9.474 -1.905,8.204 -1.524,7.823 -1.524,6.121 -1.6,6.045 -1.6,5.715 ; -0.533,-5.715 -0.533,-5.817 0,-6.35 0,-7.112 ; -0.508,5.715 -0.508,5.74 -1.067,6.299 -1.067,7.798 0,8.865 0,9.5 ; 0.025,-9.5 0.025,-8.865 1.067,-7.823 1.067,-6.274 0.533,-5.74 0.533,-5.715 ; 0.025,7.112 0.025,6.35 0.559,5.817 0.559,5.715 ; 1.626,-5.715 1.626,-6.045 1.549,-6.121 1.549,-7.823 1.93,-8.204 1.93,-9.474 ; 1.651,5.74 1.499,5.74 1.499,7.874 1.93,8.306 1.93,9.474 ; 2.565,-7.112 2.565,-6.096 2.718,-5.944 2.718,-5.715 ; 2.743,5.715 2.743,7.137 ; 3.81,-9.474 3.81,-5.715 ; 3.835,5.715 3.835,9.525
Top Overlay:
  drawing of 21 lines, arcs and shapes, not listed
Mechanical 13:
  lines w0.2: -4.65,-9.5 -4.65,9.5 4.65,9.5 4.65,-9.5 -4.65,-9.5
Mechanical 15:
  lines w0.1: -5.65,-12.1 -5.65,11.75 5.65,11.75 5.65,-12.1 -5.65,-12.1
3D body "KCPSC04-105.STEP": height 3.75, standoff 0, extent -4.65,-9.5 4.65,9.5